# Altium footprint library fszhang.PcbLib: 1032 footprints (part 8 of 66)
Each footprint in its own frame and in the unit in brackets; x right, y up, seen from the top. Pads: shape width x height; smd on the part's side, far side on the other; paste and mask are expansions set on the pad; w line width, h text height; cw(c..) or ccw(c..) is an arc to the next point about the centre after c.
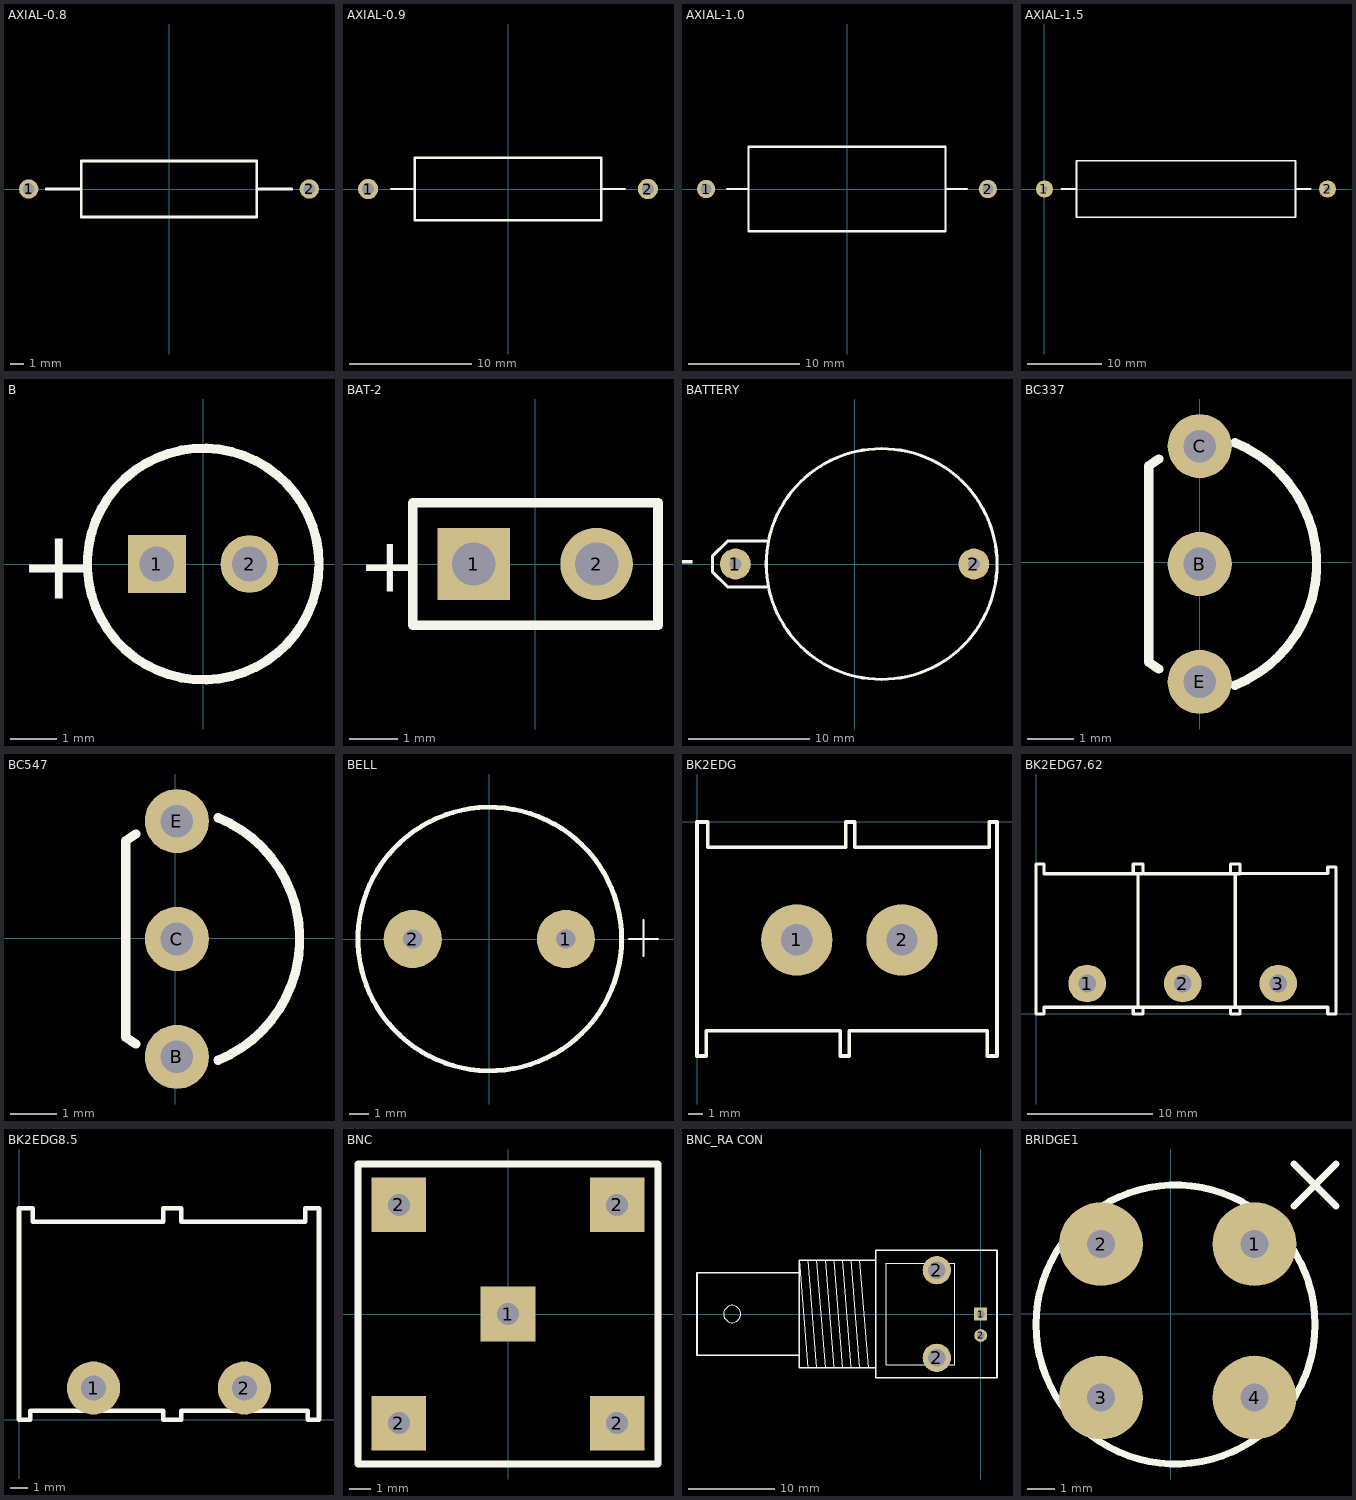
[diagram p7: the footprints below, top view; thin cyan lines are the x and y axes]

## AXIAL-0.8 [mm] "Adjustable Inductor; 2 Leads"
height 4.064
pads (2):
  round 1.4 hole 0.85: 1(-10.16,0) 2(10.16,0)
Top Overlay:
  lines w0.2: -8.89,0 -6.35,0 ; 6.35,0 8.89,0 ; -6.35,-2.032 -6.35,2.032 6.35,2.032 6.35,-2.032 -6.35,-2.032

## AXIAL-0.9 [mm] "Magnetic-Core Inductor; 2 Leads"
height 5.08
pads (2):
  round 1.65 hole 1: 1(-11.43,0) 2(11.43,0)
Top Overlay:
  lines w0.2: -9.525,0 -7.62,0 ; 7.62,0 9.525,0 ; -7.62,-2.54 -7.62,2.54 7.62,2.54 7.62,-2.54 -7.62,-2.54

## AXIAL-1.0 [mm] "Adjustable Magnetic-Core Inductor; 2 Leads"
height 7.62
pads (2):
  round 1.65 hole 1: 1(-12.7,0) 2(12.7,0)
Top Overlay:
  lines w0.2: -10.795,0 -8.89,0 ; 8.89,0 10.795,0 ; -8.89,-3.81 -8.89,3.81 8.89,3.81 8.89,-3.81 -8.89,-3.81

## AXIAL-1.5 [mil]
pads (2):
  round 90 hole 30: 1(0,0) 2(1500,0)
Top Overlay:
  lines w10: 90,0 170,0 ; 1330,0 1410,0 ; 170,0 170,-150 1330,-150 1330,150 170,150 170,0

## B [mm] "Capacitor, Electrolytic, Radial; Body 5 x 6.8 mm (Dia.xH typ); Pin Spacing 2 mm (typ)"
pads (2):
  rect 1.25x1.25 hole 0.75: 1(-1,0)
  round 1.25 hole 0.75: 2(1,0)
Top Overlay:
  circle w0.2: c0,0 r2.5
  text "+" at -3.975,-0.75 h1.5

## BAT-2 [mm] "Multicell Battery; 2 Leads"
pads (2):
  rect 1.5x1.5 hole 0.9: 1(-1.27,0)
  round 1.5 hole 0.9: 2(1.27,0)
Top Overlay:
  lines w0.2: -2.54,-1.27 -2.54,1.27 2.54,1.27 2.54,-1.27 -2.54,-1.27
  text "+" at -3.67,-0.577 h1.15

## BATTERY [mil]
pads (2):
  round 100 hole 40: 1(-387.5,0) 2(387.5,0)
Top Overlay:
  circle w10: c87.5,0 r375
  lines w10: -287.5,-75 -412.5,-75 -462.5,-25 -462.5,25 -412.5,75 -287.5,75
  text "+" at -512.5,50 h100

## BC337 [mm]
pads (3):
  round 1.38 hole 0.7: B(0,-0.04) C(0,2.5) E(0,-2.58)
Top Overlay:
  lines w0.2: -0.882,-2.303 -1.101,-2.157 -1.101,2.077 -0.882,2.223 ; 0.758,-2.65 ccw(c-0.296,-0.04) 0.758,2.57

## BC547 [mm]
pads (3):
  round 1.38 hole 0.7: B(0.04,-2.56) C(0.04,-0.02) E(0.04,2.52)
Top Overlay:
  lines w0.2: -0.842,-2.283 -1.061,-2.137 -1.061,2.097 -0.842,2.243 ; 0.925,-2.63 ccw(c-0.129,-0.02) 0.925,2.59

## BELL [mil]
pads (2):
  round 120 hole 40: 1(158,0) 2(-158,0)
Top Overlay:
  circle w10: c1.11,0 r271.89
  lines w4: 288,0 313,0 ; 302,0 348,0 ; 318,-35 318,39

## BK2EDG [mm]
pads (2):
  round 5 hole 2.2: 1(6.985,-8.255) 2(14.351,-8.255)
Top Overlay:
  lines w0.254: 0,-16.383 0,0 0.762,0 0.762,-1.778 10.414,-1.778 10.414,0 11.049,0 11.049,-1.778 20.447,-1.778 20.447,0 21,0 21,-16.383 20.32,-16.383 20.32,-14.605 10.668,-14.605 10.668,-16.383 10.033,-16.383 10.033,-14.605 0.635,-14.605 0.635,-16.383 0.082,-16.383

## BK2EDG7.62 [mm]
pads (3):
  round 3 hole 1.4: 1(4.064,2.4) 2(11.684,2.4) 3(19.304,2.4)
Top Overlay:
  lines w0.254: -0.009,-0.022 -0.009,11.878 ; -0.009,11.916 0.635,11.916 0.635,11.154 7.747,11.154 ; 0.073,-0.022 0.626,-0.022 0.626,0.508 7.747,0.508 ; 8.128,0.635 8.128,11.049 ; 8.636,11.154 15.494,11.154 ; 15.875,0.508 15.875,11.154 ; 7.747,0.508 7.747,-0.022 8.509,-0.022 8.509,0.508 ; 7.747,0.508 8.509,0.508 ; 7.747,11.154 7.747,11.916 8.509,11.916 8.509,11.154 7.747,11.154 ; 8.509,0.508 15.494,0.508 ; 15.494,0.508 15.494,-0.022 16.256,-0.022 16.256,0.508 ; 15.494,0.508 16.256,0.508 ; 15.494,11.154 15.494,11.916 16.256,11.916 16.256,11.176 ; 15.494,11.154 16.234,11.154 16.256,11.176 ; 16.256,0.508 23.241,0.508 23.241,-0.022 23.9,-0.022 23.9,11.056 23.9,11.66 23.876,11.684 23.241,11.684 23.241,11.176 16.256,11.176

## BK2EDG8.5 [mm]
pads (2):
  round 3 hole 1.4: 1(4.2,1.8) 2(12.7,1.8)
Top Overlay:
  lines w0.254: 0,0 0,11.9 ; 0,11.938 0.762,11.938 0.762,11.176 8.128,11.176 8.128,11.938 9.144,11.938 9.144,11.176 16.129,11.176 16.129,11.938 16.9,11.938 ; 0.082,0 0.635,0 0.635,0.508 8.128,0.508 8.128,0 9.144,0 9.144,0.508 16.256,0.508 16.256,0 16.9,0 16.9,11.9

## BNC [mil]
pads (5):
  rect 100x100 hole 40: 1(0,0) 2(-200,-200) 2(-200,200) 2(200,-200) 2(200,200)
Top Overlay:
  lines w12: -275,-275 -275,275 275,275 275,-275 -275,-275

## BNC_RA CON [mm] "Connector; BNC Elbow"
pads (4):
  rect 1.5x1.5 hole 0.9: 1(0,0)
  round 3.3 hole 2: 2(-5.1,-5.1) 2(-5.1,5.1)
  round 1.5 hole 0.9: 2(0,-2.5)
Top Overlay:
  circle w0.025: c-28.9,0 r1
  lines w0.025: -20.1,-6.25 -21.1,6.25 ; -20.1,6.25 -19.1,-6.25 ; -19.1,6.25 -18.1,-6.25 ; -18.1,6.25 -17.1,-6.25 ; -17.1,6.25 -16.1,-6.25 ; -16.1,6.25 -15.1,-6.25 ; -15.1,6.25 -14.1,-6.25 ; -14.1,6.25 -13.1,-6.25 ; -21.1,-4.8 -21.1,-6.25 -12.2,-6.25 ; -21.1,-4.8 -21.1,4.8 ; -21.1,-4.8 -33,-4.8 -33,4.8 -21.1,4.8 ; -21.1,4.8 -21.1,6.25 ; -21.1,6.25 -12.2,6.25 ; -12.2,-6.25 -12.2,-7.4 1.9,-7.4 1.9,7.4 -12.2,7.4 -12.2,6.25 ; -12.2,-6.25 -12.2,6.25 ; -11,-5.9 -11,5.9 -3,5.9 -3,-5.9 -11,-5.9
  lines w0.2: -21.1,-4.8 -21.1,-6.25 -12.2,-6.25 ; -21.1,-4.8 -33,-4.8 -33,4.8 -21.1,4.8 ; -21.1,-4.8 -21.1,4.8 ; -21.1,4.8 -21.1,6.25 -12.2,6.25 ; -12.2,-6.25 -12.2,-7.4 1.9,-7.4 1.9,7.4 -12.2,7.4 -12.2,6.25 ; -12.2,-6.25 -12.2,6.25

## BRIDGE1 [mil]
pads (4):
  round 120 hole 40: 1(120,100) 2(-100,100) 3(-100,-120) 4(120,-120)
Top Overlay:
  circle w10: c6.8,-15.2 r200
  lines w10: 176.8,154.8 236.8,214.8 ; 176.8,214.8 236.8,154.8